# Altium footprint library Connectors.PcbLib: 408 footprints (part 7 of 26)
Each footprint in its own frame and in the unit in brackets; x right, y up, seen from the top. Pads: shape width x height; smd on the part's side, far side on the other; paste and mask are expansions set on the pad; w line width, h text height; cw(c..) or ccw(c..) is an arc to the next point about the centre after c.
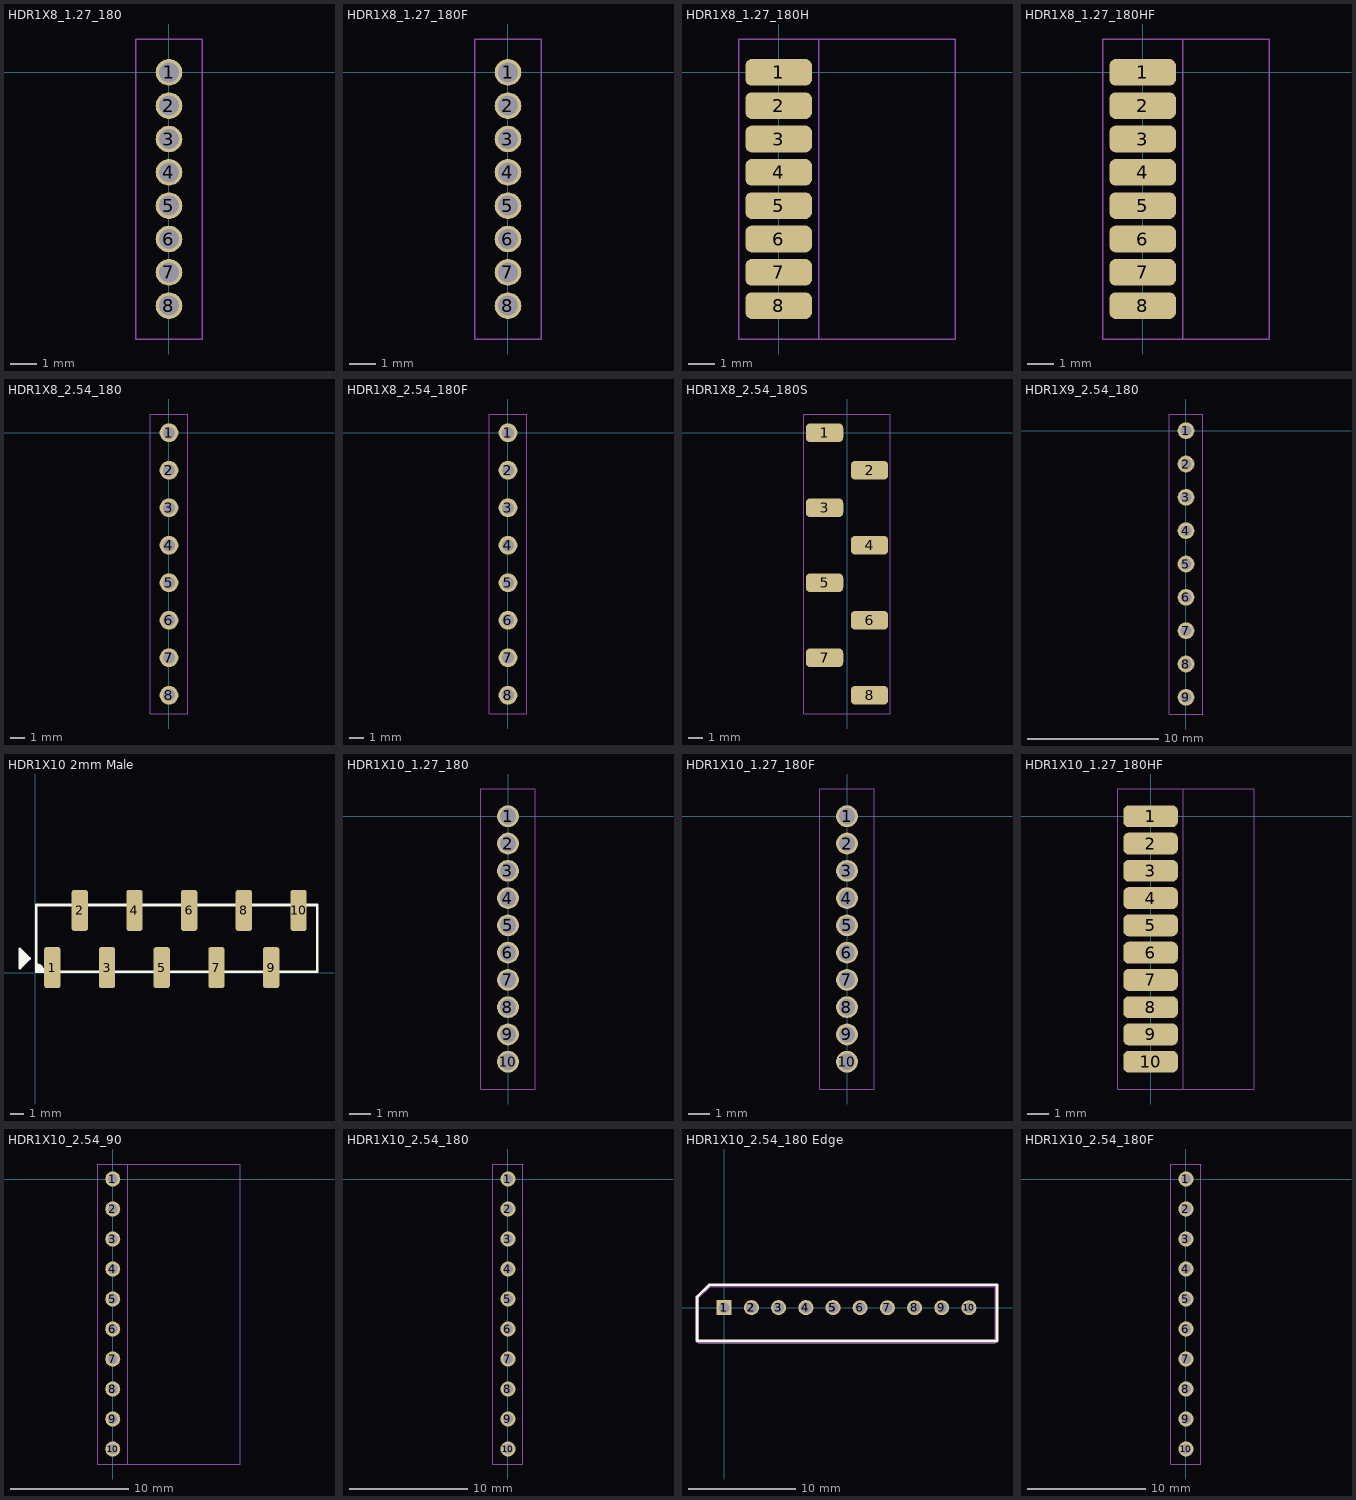
[diagram p6: the footprints below, top view; thin cyan lines are the x and y axes]

## HDR1X8_1.27_180 [mil]
height 169.29
pads (8):
  round 40 hole 30: 1(0,0) 2(0,-50) 3(0,-100) 4(0,-150) 5(0,-200) 6(0,-250) 7(0,-300) 8(0,-350)
Mechanical 13:
  lines w2: -50,-400 -50,50 50,50 50,-400 -50,-400
Mechanical 14:
  lines w2: -50,-400 -50,50 50,50 50,-400 -50,-400
  text ".Designator" at -31,-195 h80
3D body "pin_header_a-sl127-eg-z08d.stp": height 210.24, standoff -102.36, extent -49.21,-374.99 49.21,25.01

## HDR1X8_1.27_180F [mil]
height 169.29
pads (8):
  round 40 hole 30: 1(0,0) 2(0,-50) 3(0,-100) 4(0,-150) 5(0,-200) 6(0,-250) 7(0,-300) 8(0,-350)
Mechanical 13:
  lines w2: -50,-400 -50,50 50,50 50,-400 -50,-400
Mechanical 14:
  lines w2: -50,-400 -50,50 50,50 50,-400 -50,-400
  text ".Designator" at -31,-195 h80
3D body "female_header_a-bl127-eg-z08d.stp": height 133.86, standoff -94.49, extent -35.43,-382.88 35.43,32.87

## HDR1X8_1.27_180H [mil]
height 169.29
pads (8):
  rrect50% 100x40 smd: 1(0,0) 2(0,-50) 3(0,-100) 4(0,-150) 5(0,-200) 6(0,-250) 7(0,-300) 8(0,-350)
Mechanical 13:
  lines w2: -60,-400 265,-400 265,50 -60,50 -60,-400
Mechanical 14:
  lines w2: -60,-400 60,-400 60,50 -60,50 -60,-400
  text ".Designator" at -31,-195 h80
3D body "pin_header_a-sl127-eg-g08d.stp": height 49.21, standoff -49.21, extent -47.36,-375 265.24,25

## HDR1X8_1.27_180HF [mil]
height 169.29
pads (8):
  rrect50% 100x40 smd: 1(0,0) 2(0,-50) 3(0,-100) 4(0,-150) 5(0,-200) 6(0,-250) 7(0,-300) 8(0,-350)
Mechanical 13:
  lines w2: -60,-400 -60,50 190,50 190,-400 -60,-400
Mechanical 14:
  lines w2: -60,-400 -60,50 60,50 60,-400 -60,-400
  text ".Designator" at -31,-195 h80
3D body "female_header_a-bl127-eg-z08d.stp": height 71.43, standoff 0.57, extent -39.48,-382.88 188.87,32.87

## HDR1X8_2.54_180 [mil]
height 169.29
pads (8):
  round 50 hole 32: 1(0,0) 2(0,-100) 3(0,-200) 4(0,-300) 5(0,-400) 6(0,-500) 7(0,-600) 8(0,-700)
Mechanical 13:
  lines w2: -50,-750 -50,50 50,50 50,-750 -50,-750
Mechanical 14:
  lines w2: -50,-750 50,-750 50,50 -50,50 -50,-750
  text ".Designator" at -31,-370 h80
3D body "pin_header_aw140-eg-g08d.stp": height 322.83, standoff -118.11, extent -49.18,-750 49.18,49.99

## HDR1X8_2.54_180F [mil]
height 169.29
pads (8):
  round 50 hole 32: 1(0,0) 2(0,-100) 3(0,-200) 4(0,-300) 5(0,-400) 6(0,-500) 7(0,-600) 8(0,-700)
Mechanical 13:
  lines w2: -50,-750 -50,50 50,50 50,-750 -50,-750
Mechanical 14:
  lines w2: -50,-750 -50,50 50,50 50,-750 -50,-750
  text ".Designator" at -31,-370 h80
3D body "female_header_a-bl254-eg-g08d.stp": height 334.65, standoff -125.98, extent -49.21,-754.84 49.21,55

## HDR1X8_2.54_180S [mil]
height 169.29
pads (8):
  rrect50% 100x50 smd: 1(-60,0) 2(60,-100) 3(-60,-200) 4(60,-300) 5(-60,-400) 6(60,-500) 7(-60,-600) 8(60,-700)
Mechanical 13:
  lines w2: -115,-750 115,-750 115,50 -115,50 -115,-750
Mechanical 14:
  lines w2: -115,-750 -115,50 115,50 115,-750 -115,-750
  text ".Designator" at -31,-370 h80
3D body "pin_header_a-sl254-eg-g08mp1.stp": height 386.46, standoff -0.94, extent -98.56,-746.06 98.29,53.94

## HDR1X9_2.54_180 [mil]
height 169.29
pads (9):
  round 50 hole 32: 1(0,0) 2(0,-100) 3(0,-200) 4(0,-300) 5(0,-400) 6(0,-500) 7(0,-600) 8(0,-700) 9(0,-800)
Mechanical 13:
  lines w2: -50,-850 -50,50 50,50 50,-850 -50,-850
Mechanical 14:
  lines w2: -50,-850 50,-850 50,50 -50,50 -50,-850
  text ".Designator" at -31,-420 h80
3D body "pin_header_aw140-eg-g09d.stp": height 322.83, standoff -118.11, extent -49.18,-849.99 49.18,50

## HDR1X10 2mm Male [mm]
pads (10):
  rrect30% 1.2x3 smd: 1(1.251,0.39) 2(3.262,4.579) 3(5.263,0.39) 4(7.274,4.579) 5(9.275,0.39) 6(11.286,4.579) 7(13.287,0.39) 8(15.298,4.579) 9(17.299,0.39) 10(19.31,4.579)
Top Overlay:
  rectangle: -0.782,0.842 -0.532,1.282
  rectangle: -1.194,0.702 -0.702,1.432
  rectangle: -1.143,0.523 -0.869,1.574
  region: 0.028,0.082 0.028,0.562 0.278,0.562 0.568,0.272 0.568,0.082
  lines w0.2: -1.137,0.341 -1.137,1.769 ; -1.118,0.346 -0.412,1.052 -1.118,1.758 ; 0.078,0.602 cw(c0.078,0.102) 0.578,0.102 ; 0.118,0.422 0.148,0.422 cw(c0.148,0.082) 0.488,0.082 ; 0.078,0.082 20.678,0.082 20.678,4.981 0.078,4.981 0.078,0.082
3D body "pin_header_a-sl200-eg-g10mp1.stp": height 6.5, standoff 0, extent 0.28,0.262 20.23,4.762

## HDR1X10_1.27_180 [mil]
height 169.29
pads (10):
  round 40 hole 30: 1(0,0) 2(0,-50) 3(0,-100) 4(0,-150) 5(0,-200) 6(0,-250) 7(0,-300) 8(0,-350) 9(0,-400) 10(0,-450)
Mechanical 13:
  lines w2: -50,-500 50,-500 50,50 -50,50 -50,-500
Mechanical 14:
  lines w2: -50,-500 50,-500 50,50 -50,50 -50,-500
  text ".Designator" at -31,-245 h80
3D body "pin_header_a-sl127-eg-g10d.stp": height 210.24, standoff -102.36, extent -49.21,-474.99 49.21,25.01

## HDR1X10_1.27_180F [mil]
height 169.29
pads (10):
  round 40 hole 30: 1(0,0) 2(0,-50) 3(0,-100) 4(0,-150) 5(0,-200) 6(0,-250) 7(0,-300) 8(0,-350) 9(0,-400) 10(0,-450)
Mechanical 13:
  lines w2: -50,-500 -50,50 50,50 50,-500 -50,-500
Mechanical 14:
  lines w2: -50,-500 -50,50 50,50 50,-500 -50,-500
  text ".Designator" at -31,-245 h80
3D body "female_header_a-bl127-eg-g10d.stp": height 133.86, standoff -94.49, extent -35.43,-482.87 35.44,32.88

## HDR1X10_1.27_180HF [mil]
height 169.29
pads (10):
  rrect50% 100x40 smd: 1(0,0) 2(0,-50) 3(0,-100) 4(0,-150) 5(0,-200) 6(0,-250) 7(0,-300) 8(0,-350) 9(0,-400) 10(0,-450)
Mechanical 13:
  lines w2: -60,-500 190,-500 190,50 -60,50 -60,-500
Mechanical 14:
  lines w2: -60,-500 60,-500 60,50 -60,50 -60,-500
  text ".Designator" at -31,-245 h80
3D body "female_header_a-bl127-eg-g10d.stp": height 71.43, standoff 0.57, extent -39.48,-482.88 188.87,32.87

## HDR1X10_2.54_90 [mil]
height 169.29
pads (10):
  round 50 hole 32: 1(0,0) 2(0,-100) 3(0,-200) 4(0,-300) 5(0,-400) 6(0,-500) 7(0,-600) 8(0,-700) 9(0,-800) 10(0,-900)
Mechanical 13:
  lines w2: -50,-950 -50,50 425,50 425,-950 -50,-950
Mechanical 14:
  lines w2: -50,-950 -50,50 50,50 50,-950 -50,-950
  text ".Designator" at -31,-470 h80
3D body "pin_header_aw140-ea-g10g.stp": height 99.21, standoff -93.7, extent -15,-946.06 423.58,46.06

## HDR1X10_2.54_180 [mil]
height 169.29
pads (10):
  round 50 hole 32: 1(0,0) 2(0,-100) 3(0,-200) 4(0,-300) 5(0,-400) 6(0,-500) 7(0,-600) 8(0,-700) 9(0,-800) 10(0,-900)
Mechanical 13:
  lines w2: -50,-950 50,-950 50,50 -50,50 -50,-950
Mechanical 14:
  lines w2: -50,-950 -50,50 50,50 50,-950 -50,-950
  text ".Designator" at -31,-470 h80
3D body "pin_header_aw140-eg-g10d.stp": height 322.83, standoff -118.11, extent -49.18,-950 49.18,50

## HDR1X10_2.54_180 Edge [mm]
height 4.3
pads (15):
  round 1.4 hole 1: 1(0,0) 2(2.54,0) 2(2.555,0.003) 3(5.08,0) 3(5.081,0.004) 4(7.62,0) 4(7.635,0.003) 5(10.16,0) 5(10.175,0.003) 6(12.7,0) 7(15.24,-0.002) 8(17.78,-0.002) 9(20.32,-0.002) 10(22.86,-0.002)
  rect 1.4x1.4 hole 1: 1(0.001,0.004)
Top Overlay:
  lines w0.254: -2.539,-3.117 -2.539,1.014 -1.387,2.145 25.48,2.145 25.48,-3.117 ; -2.531,-3.117 25.429,-3.117
Mechanical 13:
  lines w0.051: -2.37,-3.32 25.312,-3.32 25.312,1.982 -1.315,1.982 -2.37,0.927 -2.37,-3.32
Mechanical 14:
  lines w0.051: -2.366,-3.317 25.324,-3.317 25.324,1.98 -1.312,1.98 -2.366,0.926 -2.366,-3.317
3D body "JST B6B-XH-A.STEP": height 7, standoff -3.4, extent -2.304,-3.247 15.096,2.503
3D body "JST B6B-XH-A.STEP": height 7, standoff -3.4, extent 7.8,-3.238 25.2,2.512

## HDR1X10_2.54_180F [mil]
height 169.29
pads (10):
  round 50 hole 32: 1(0,0) 2(0,-100) 3(0,-200) 4(0,-300) 5(0,-400) 6(0,-500) 7(0,-600) 8(0,-700) 9(0,-800) 10(0,-900)
Mechanical 13:
  lines w2: -50,-950 -50,50 50,50 50,-950 -50,-950
Mechanical 14:
  lines w2: -50,-950 50,-950 50,50 -50,50 -50,-950
  text ".Designator" at -31,-470 h80
3D body "female_header_a-bl254-eg-g10d.stp": height 334.65, standoff -125.98, extent -49.2,-954.92 49.22,54.92